# Altium footprint library IC.PcbLib: 14 footprints
Each footprint in its own frame and in the unit in brackets; x right, y up, seen from the top. Pads: shape width x height; smd on the part's side, far side on the other; paste and mask are expansions set on the pad; w line width, h text height; cw(c..) or ccw(c..) is an arc to the next point about the centre after c.
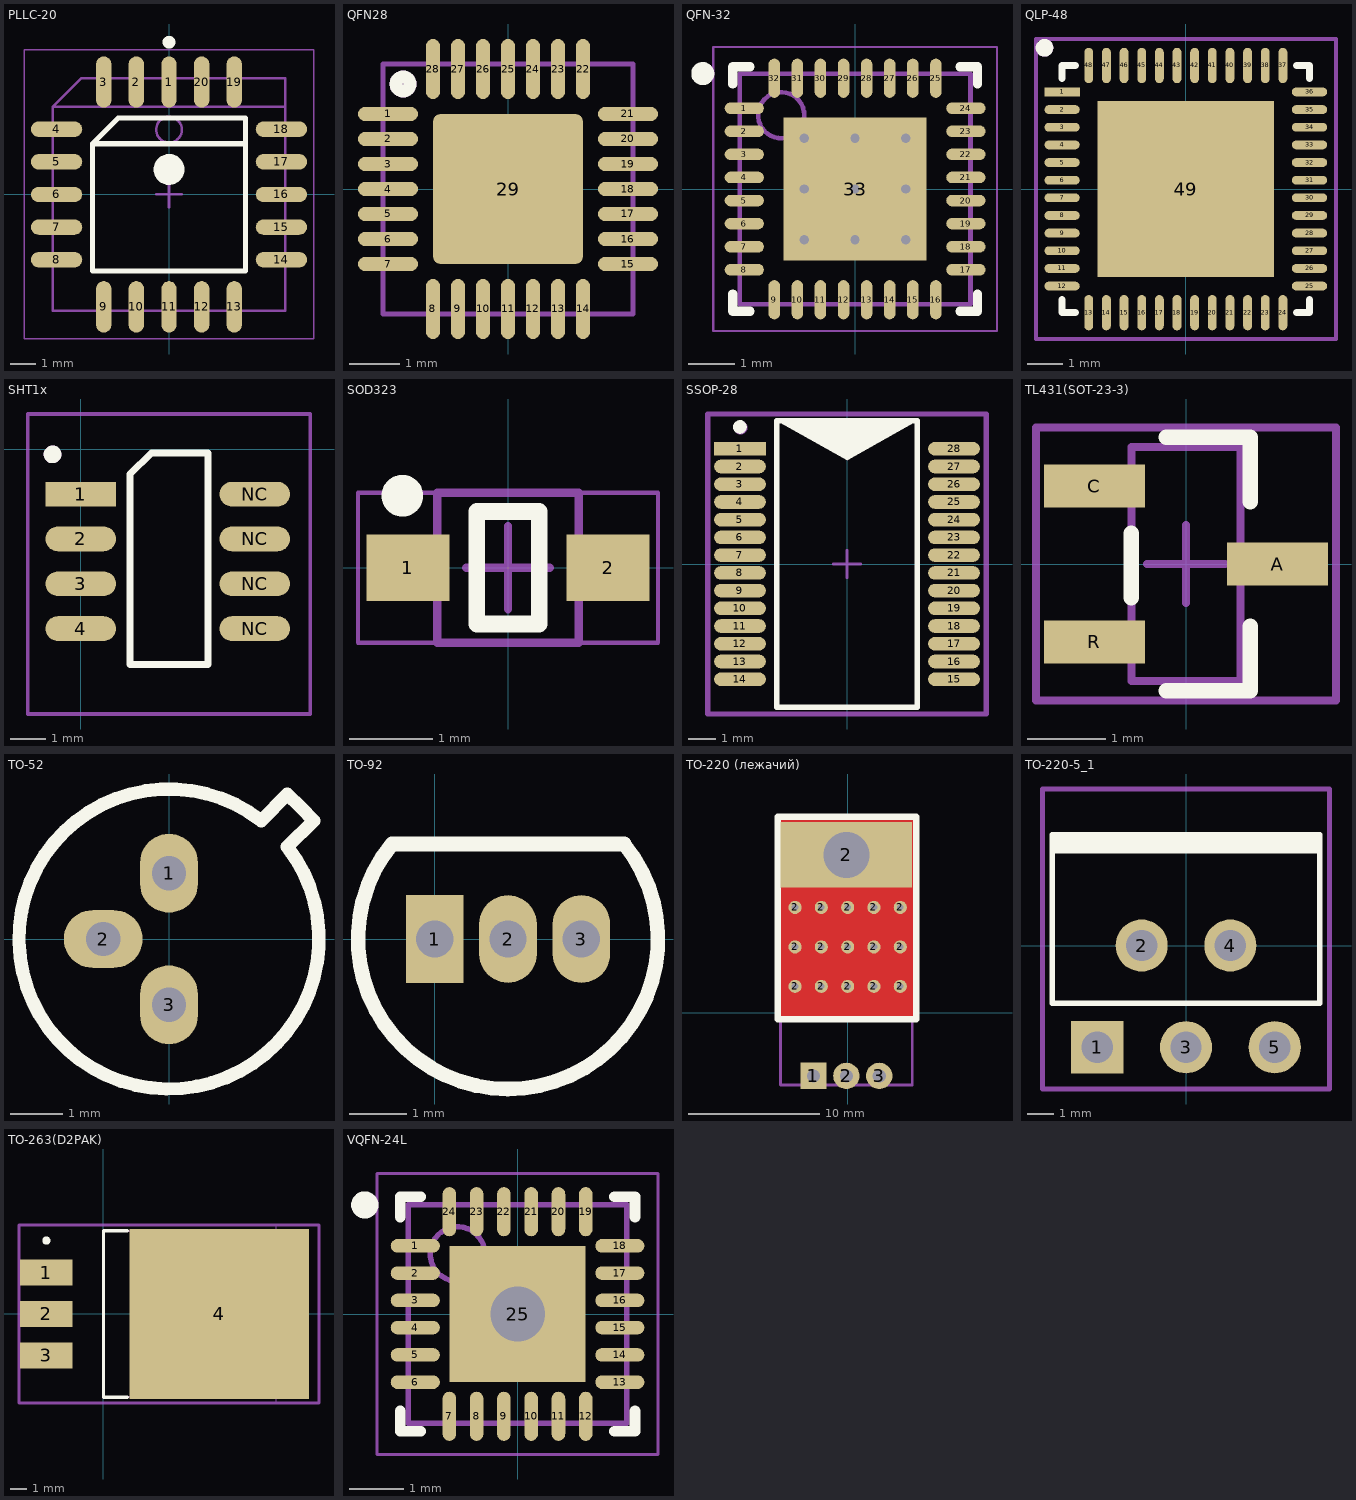
[diagram p0: the footprints below, top view; thin cyan lines are the x and y axes]

## PLLC-20 [mm] "Leaded Chip Carrier, 20-Leads, Body 9,90x9,90mm, Pitch 1,270mm, IPC Medium Density"
height 4.57
pads (20):
  oval 0.6x2 smd: 1(0,4.375) 2(-1.27,4.375) 3(-2.54,4.375) 9(-2.54,-4.375) 10(-1.27,-4.375) 11(0,-4.375) 12(1.27,-4.375) 13(2.54,-4.375) 19(2.54,4.375) 20(1.27,4.375)
  oval 2x0.6 smd: 4(-4.375,2.54) 5(-4.375,1.27) 6(-4.375,0) 7(-4.375,-1.27) 8(-4.375,-2.54) 14(4.375,-2.54) 15(4.375,-1.27) 16(4.375,0) 17(4.375,1.27) 18(4.375,2.54)
Top Overlay:
  circle w0.25: c0,5.925 r0.125
  circle w0.6: c0,0.975 r0.3
  lines w0.2: 2.975,1.975 -2.975,1.975 ; -2.975,1.975 -1.975,2.975 2.975,2.975 2.975,-2.975 -2.975,-2.975 -2.975,1.975
Mechanical 13:
  circle w0.1: c0,2.52 r0.5
  lines w0.1: 4.52,3.42 -4.52,3.42 ; -4.52,3.42 -4.52,-4.52 4.52,-4.52 4.52,4.52 -3.42,4.52 -4.52,3.42
Mechanical 15:
  lines w0.05: -5.625,-5.625 -5.625,5.625 5.625,5.625 5.625,-5.625 -5.625,-5.625
  lines w0.1: -0.5,0 0.5,0 ; 0,-0.5 0,0.5
3D body "PLCC-20.STEP": height 4.51, standoff -0.01, extent -4.984,-4.892 5,5.092

## QFN28 [mm] "pitch 0.5 5x5mm"
pads (29):
  oval 1.2x0.28 smd: 1(-2.4,1.5) 2(-2.4,1) 3(-2.4,0.5) 4(-2.4,0) 5(-2.4,-0.5) 6(-2.4,-1) 7(-2.4,-1.5) 15(2.4,-1.5) 16(2.4,-1) 17(2.4,-0.5) 18(2.4,0) 19(2.4,0.5) 20(2.4,1) 21(2.4,1.5)
  oval 0.28x1.2 smd: 8(-1.5,-2.4) 9(-1,-2.4) 10(-0.5,-2.4) 11(0,-2.4) 12(0.5,-2.4) 13(1,-2.4) 14(1.5,-2.4) 22(1.5,2.4) 23(1,2.4) 24(0.5,2.4) 25(0,2.4) 26(-0.5,2.4) 27(-1,2.4) 28(-1.5,2.4)
  rrect10% 3x3 smd: 29(0,0)
Top Overlay:
  circle w0.254: c-2.1,2.1 r0.141
Mechanical 13:
  lines w0.1: -2.5,-2.5 2.5,-2.5 2.5,2.5 -2.5,2.5 -2.5,-2.5
Mechanical 29:
  circle w0.254: c-2.1,2.1 r0.141
  lines w0.1: -2.5,-2.5 -2.5,2.5 2.5,2.5 2.5,-2.5 -2.5,-2.5
  text ".Designator" at -2.1,-0.6 h2
3D body "QFN28-0_5 5x5mm.STEP": height 1, standoff 0, extent -2.5,-2.5 2.5,2.5

## QFN-32 [mm]
height 0.9
pads (33):
  oval 0.85x0.25 smd: 1(-2.4,1.75) 2(-2.4,1.25) 3(-2.4,0.75) 4(-2.4,0.25) 5(-2.4,-0.25) 6(-2.4,-0.75) 7(-2.4,-1.25) 8(-2.4,-1.75) 17(2.4,-1.75) 18(2.4,-1.25) 19(2.4,-0.75) 20(2.4,-0.25) 21(2.4,0.25) 22(2.4,0.75) 23(2.4,1.25) 24(2.4,1.75)
  oval 0.25x0.85 smd: 9(-1.75,-2.4) 10(-1.25,-2.4) 11(-0.75,-2.4) 12(-0.25,-2.4) 13(0.25,-2.4) 14(0.75,-2.4) 15(1.25,-2.4) 16(1.75,-2.4) 25(1.75,2.4) 26(1.25,2.4) 27(0.75,2.4) 28(0.25,2.4) 29(-0.25,2.4) 30(-0.75,2.4) 31(-1.25,2.4) 32(-1.75,2.4)
  rect 3.1x3.1 smd: 33(0,0)
via 1.1,-1.1 diameter 0.5 hole 0.2
via 0,-1.1 diameter 0.5 hole 0.2
via -1.1,-1.1 diameter 0.5 hole 0.2
via 1.1,0 diameter 0.5 hole 0.2
via 0,0 diameter 0.5 hole 0.2
via -1.1,0 diameter 0.5 hole 0.2
via 1.1,1.1 diameter 0.5 hole 0.2
via 0,1.1 diameter 0.5 hole 0.2
via -1.1,1.1 diameter 0.5 hole 0.2
Top Overlay:
  circle w0.25: c-3.3,2.5 r0.125
  lines w0.2: -2.65,-2.275 -2.65,-2.65 -2.275,-2.65 ; -2.65,2.275 -2.65,2.65 -2.275,2.65 ; 2.275,-2.65 2.65,-2.65 2.65,-2.275 ; 2.275,2.65 2.65,2.65 2.65,2.275
Mechanical 13:
  circle w0.1: c-1.6,1.6 r0.5
  lines w0.1: -2.5,-2.5 2.5,-2.5 2.5,2.5 -2.5,2.5 -2.5,-2.5
Mechanical 15:
  lines w0.05: -3.075,-3.075 3.075,-3.075 3.075,3.075 -3.075,3.075 -3.075,-3.075
  lines w0.1: -0.5,0 0.5,0 ; 0,-0.5 0,0.5
3D body "User Library-MAX9984.step": height 0.73, standoff -0.02, extent -2.5,-2.5 2.5,2.5

## QLP-48 [mm] "LQFP-48, 48-Leads, Body 7,00x7,00mm, Pitch 0,50mm"
height 1.6
pads (49):
  rect 1x0.25 smd: 1(-3.505,2.753)
  oval 1x0.25 smd: 2(-3.505,2.253) 3(-3.505,1.753) 4(-3.505,1.253) 5(-3.505,0.753) 6(-3.505,0.253) 7(-3.505,-0.247) 8(-3.505,-0.747) 9(-3.505,-1.247) 10(-3.505,-1.747) 11(-3.505,-2.247) 12(-3.505,-2.747) 25(3.505,-2.747) 26(3.505,-2.247) 27(3.505,-1.747) 28(3.505,-1.247) 29(3.505,-0.747) 30(3.505,-0.247) 31(3.505,0.253) 32(3.505,0.753) 33(3.505,1.253) 34(3.505,1.753) 35(3.505,2.253) 36(3.505,2.753)
  oval 0.25x1 smd: 13(-2.75,-3.503) 14(-2.25,-3.503) 15(-1.75,-3.503) 16(-1.25,-3.503) 17(-0.75,-3.503) 18(-0.25,-3.503) 19(0.25,-3.503) 20(0.75,-3.503) 21(1.25,-3.503) 22(1.75,-3.503) 23(2.25,-3.503) 24(2.75,-3.503) 37(2.75,3.503) 38(2.25,3.503) 39(1.75,3.503) 40(1.25,3.503) 41(0.75,3.503) 42(0.25,3.503) 43(-0.25,3.503) 44(-0.75,3.503) 45(-1.25,3.503) 46(-1.75,3.503) 47(-2.25,3.503) 48(-2.75,3.503)
  rect 5x5 smd: 49(0,0.002)
Top Overlay:
  circle w0.25: c-4.005,4.003 r0.125
  lines w0.2: -3.505,-3.128 -3.505,-3.503 -3.13,-3.503 ; -3.505,3.128 -3.505,3.503 -3.13,3.503 ; 3.13,-3.503 3.505,-3.503 3.505,-3.128 ; 3.13,3.503 3.505,3.503 3.505,3.128
Mechanical 29:
  circle w0.25: c-4.005,4.003 r0.125
  lines w0.1: -4.245,-4.247 -4.245,4.253 4.255,4.253 4.255,-4.247 -4.245,-4.247
  text ".Designator" at -2.5,-0.497 h1.5
3D body "QFN48.STEP": height 0.83, standoff -0.02, extent -3.505,-3.503 3.505,3.503

## SHT1x [mm]
pads (8):
  rect 2x0.7 smd: 1(0,-1.27)
  oval 2x0.7 smd: 2(0,-2.54) 3(0,-3.81) 4(0,-5.08) NC(4.93,-5.08) NC(4.93,-3.81) NC(4.93,-2.54) NC(4.93,-1.27)
Top Overlay:
  circle w0.25: c-0.8,-0.145 r0.125
  lines w0.2: 1.4,-6.1 3.6,-6.1 3.6,-0.1 2,-0.1 1.4,-0.7 1.4,-6.1
Mechanical 29:
  circle w0.25: c-0.8,-0.145 r0.125
  lines w0.1: -1.5,-7.5 -1.5,1 6.5,1 6.5,-7.5 -1.5,-7.5
  text ".Designator" at 0.5,-3.5 h1
3D body "SHT1x.step": height 2.45, standoff 0.09, extent 0,-6.935 4.93,0.535

## SOD323 [mm] "SOIC, 2-Leads, Body 2,60x1,60mm, Pitch 1,27mm, IPC Medium Density"
height 1.2
pads (2):
  rect 1x0.8 smd: 1(-1.2,0) 2(1.2,0)
Top Overlay:
  circle w0.25: c-1.268,0.864 r0.125
  lines w0.2: -0.375,-0.675 -0.375,0.675 0.375,0.675 0.375,-0.675 -0.375,-0.675
Mechanical 13:
  lines w0.1: -0.85,-0.9 -0.85,0.9 0.85,0.9 0.85,-0.9 -0.85,-0.9
Mechanical 15:
  lines w0.05: -1.8,-0.9 -1.8,0.9 1.8,0.9 1.8,-0.9 -1.8,-0.9
  lines w0.1: -0.5,0 0.5,0 ; 0,-0.5 0,0.5
3D body "SOD-323.step": height 1.1, standoff 0, extent -1.3,-0.675 1.3,0.675

## SSOP-28 [mm]
height 2
pads (28):
  rect 1.9x0.5 smd: 1(-3.925,4.225)
  oval 1.9x0.5 smd: 2(-3.925,3.575) 3(-3.925,2.925) 4(-3.925,2.275) 5(-3.925,1.625) 6(-3.925,0.975) 7(-3.925,0.325) 8(-3.925,-0.325) 9(-3.925,-0.975) 10(-3.925,-1.625) 11(-3.925,-2.275) 12(-3.925,-2.925) 13(-3.925,-3.575) 14(-3.925,-4.225) 15(3.925,-4.225) 16(3.925,-3.575) 17(3.925,-2.925) 18(3.925,-2.275) 19(3.925,-1.625) 20(3.925,-0.975) 21(3.925,-0.325) 22(3.925,0.325) 23(3.925,0.975) 24(3.925,1.625) 25(3.925,2.275) 26(3.925,2.925) 27(3.925,3.575) 28(3.925,4.225)
Top Overlay:
  circle w0.25: c-3.925,5.025 r0.125
  region: -2.575,5.25 2.575,5.25 0,3.81
  lines w0.2: -2.575,-5.25 -2.575,5.25 2.575,5.25 2.575,-5.25 -2.575,-5.25
Mechanical 15:
  lines w0.1: -0.5,0 0.5,0 ; 0,-0.5 0,0.5
Mechanical 29:
  circle w0.25: c-3.9,5 r0.125
  lines w0.2: -5.1,-5.5 -5.1,5.5 5.1,5.5 5.1,-5.5 -5.1,-5.5
  text ".Designator" at -2.5,-0.1 h2
3D body "SSOP-28.step": height 2.15, standoff 0, extent -3.878,-5.165 3.878,5.165

## TL431(SOT-23-3) [mm]
height 1.1
pads (3):
  rect 1.3x0.55 smd: A(1.175,0) C(-1.175,1.001) R(-1.175,-1.001)
Top Overlay:
  lines w0.2: -0.7,-0.432 -0.7,0.393 ; -0.254,-1.625 0.825,-1.625 0.825,-0.8 ; -0.254,1.625 0.825,1.625 0.825,0.8
Mechanical 13:
  lines w0.1: -0.7,-1.5 0.7,-1.5 0.7,1.5 -0.7,1.5 -0.7,-1.5
Mechanical 15:
  lines w0.1: -0.5,0 0.5,0 ; 0,-0.5 0,0.5 ; -1.925,-1.75 1.925,-1.75 1.925,1.75 -1.925,1.75 -1.925,-1.75
3D body "SOT-23-3-1.STEP": height 1.1, standoff 0, extent -1.271,-1.5 1.271,1.5

## TO-52 [mm]
pads (3):
  oval 1.1x1.5 hole 0.65: 1(0,1.25) 3(0,-1.25)
  oval 1.5x1.1 hole 0.65: 2(-1.25,0)
Top Overlay:
  lines w0.254: 1.75,2.25 ccw(c0,0) 2.25,1.75 2.75,2.25 2.505,2.505 2.25,2.75 1.75,2.25
Bottom Overlay:
  circle w0.25: c1.067,1.321 r0.125
3D body "TO-52.step": height 8.08, standoff -8.7, extent -4.127,-4.127 4.804,4.804

## TO-92 [mm]
pads (3):
  rect 1x1.524 hole 0.65: 1(0,0)
  oval 1x1.524 hole 0.65: 2(1.275,0) 3(2.55,0)
Top Overlay:
  lines w0.254: 3.294,1.646 cw(c1.275,0) -0.74,1.651 3.294,1.651
Bottom Overlay:
  circle w0.25: c-0.025,-1.27 r0.125
3D body "TO-92(plastik)-1.step": height 10.55, standoff -3.65, extent -1.12,-2.349 3.674,1.651

## TO-220 (лежачий) [mm]
pads (19):
  rect 2x2 hole 1: 1(-2.6,-4.8)
  round 1 hole 0.5: 2(-4,2) 2(-4,5) 2(-4,8) 2(-2,2) 2(-2,5) 2(-2,8) 2(0,2) 2(0,5) 2(0,8) 2(2,2) 2(2,5) 2(2,8) 2(4,2) 2(4,5) 2(4,8)
  round 2 hole 1: 2(-0.1,-4.8) 3(2.4,-4.8)
  rect 10x5 hole 3.5: 2(-0.1,12)
Top Layer:
  rectangle: -5.3,-0.5 5.2,15
Top Overlay:
  circle w0.2: c-0.1,12 r2
  lines w0.5: -5.3,-0.5 5.2,-0.5 5.2,14.9 -5.3,14.9 -5.3,-0.5
Mechanical 15:
  lines w0.2: -5.1,-5.5 -5.1,14.7 4.9,14.7 4.9,-5.5 -5.1,-5.5
3D body "TO220 L.step": height 4.7, standoff -2.8, extent -5.1,-5.052 4.9,14.652

## TO-220-5_1 [mm]
pads (5):
  rect 2x2 hole 1.2: 1(-3.4,-3.9)
  round 2 hole 1.2: 2(-1.7,0) 3(0,-3.9) 4(1.7,0) 5(3.4,-3.9)
Top Overlay:
  lines w0.2: -5.125,3.625 5.125,3.625 ; -5.125,3.75 5,3.75 5.125,3.875 -5,3.875 -5,4.125 5.125,4.125 ; -5.125,4 5.125,4 ; -5.125,-2.21 -5.125,4.25 5.125,4.25 5.125,-2.21 -5.125,-2.21
Mechanical 15:
  lines w0.2: -5.5,-5.5 -5.5,6 5.5,6 5.5,-5.5 -5.5,-5.5
3D body "TO220-5.STEP": height 21.35, standoff -2.64, extent -5.105,-4.074 5.055,4.166

## TO-263(D2PAK) [mm]
height 4.65
pads (4):
  rect 3.2x1.6 smd: 1(-3.5,2.54) 2(-3.5,0) 3(-3.5,-2.54)
  rect 11x10.4 smd: 4(7.1,0)
Top Overlay:
  circle w0.25: c-3.5,4.5 r0.125
  lines w0.2: 1.45,-5.1 0,-5.1 0,5.1 1.45,5.1
Mechanical 13:
  lines w0.1: 0,-5.075 8.64,-5.075 8.64,5.075 0,5.075 0,-5.075
Mechanical 15:
  lines w0.05: -5.175,-5.45 10.575,-5.45 10.575,5.45 -5.175,5.45 -5.175,-5.45
  lines w0.1: 2.2,0 3.2,0 ; 2.7,-0.5 2.7,0.5
Mechanical 29:
  lines w0.2: -5.175,-5.45 13.2,-5.45 13.2,5.45 -5.175,5.45 -5.175,-5.45
  text ".Designator" at 0,2.1 h1.5
3D body "TO-263.STEP": height 4.69, standoff 0, extent -3.83,-5.08 11.61,5.08

## VQFN-24L [mm] "VQFN-24L , 24-Leads, Body 4,00x4,00mm, Pitch 0,50mm, Thermal Pad 2,50x2,50mm, IPC Medium Density"
height 1
pads (25):
  oval 0.9x0.25 smd: 1(-1.875,1.25) 2(-1.875,0.75) 3(-1.875,0.25) 4(-1.875,-0.25) 5(-1.875,-0.75) 6(-1.875,-1.25) 13(1.875,-1.25) 14(1.875,-0.75) 15(1.875,-0.25) 16(1.875,0.25) 17(1.875,0.75) 18(1.875,1.25)
  oval 0.25x0.9 smd: 7(-1.25,-1.875) 8(-0.75,-1.875) 9(-0.25,-1.875) 10(0.25,-1.875) 11(0.75,-1.875) 12(1.25,-1.875) 19(1.25,1.875) 20(0.75,1.875) 21(0.25,1.875) 22(-0.25,1.875) 23(-0.75,1.875) 24(-1.25,1.875)
  rect 2.5x2.5 hole 1: 25(0,0)
Top Overlay:
  circle w0.25: c-2.8,2 r0.125
  lines w0.2: -2.15,-1.775 -2.15,-2.15 -1.775,-2.15 ; -2.15,1.775 -2.15,2.15 -1.775,2.15 ; 1.775,-2.15 2.15,-2.15 2.15,-1.775 ; 1.775,2.15 2.15,2.15 2.15,1.775
Mechanical 13:
  circle w0.1: c-1.1,1.1 r0.5
  lines w0.1: -2,-2 2,-2 2,2 -2,2 -2,-2
Mechanical 15:
  lines w0.05: -2.575,-2.575 2.575,-2.575 2.575,2.575 -2.575,2.575 -2.575,-2.575
  lines w0.1: -0.5,0 0.5,0 ; 0,-0.5 0,0.5
3D body "User Library-VQFN-24.step": height 1.06, standoff -0.01, extent -2.056,-2.047 2.044,2.053